# Altium footprint library DPIAT_202303.PcbLib: 77 footprints (part 5 of 5)
Each footprint in its own frame and in the unit in brackets; x right, y up, seen from the top. Pads: shape width x height; smd on the part's side, far side on the other; paste and mask are expansions set on the pad; w line width, h text height; cw(c..) or ccw(c..) is an arc to the next point about the centre after c.
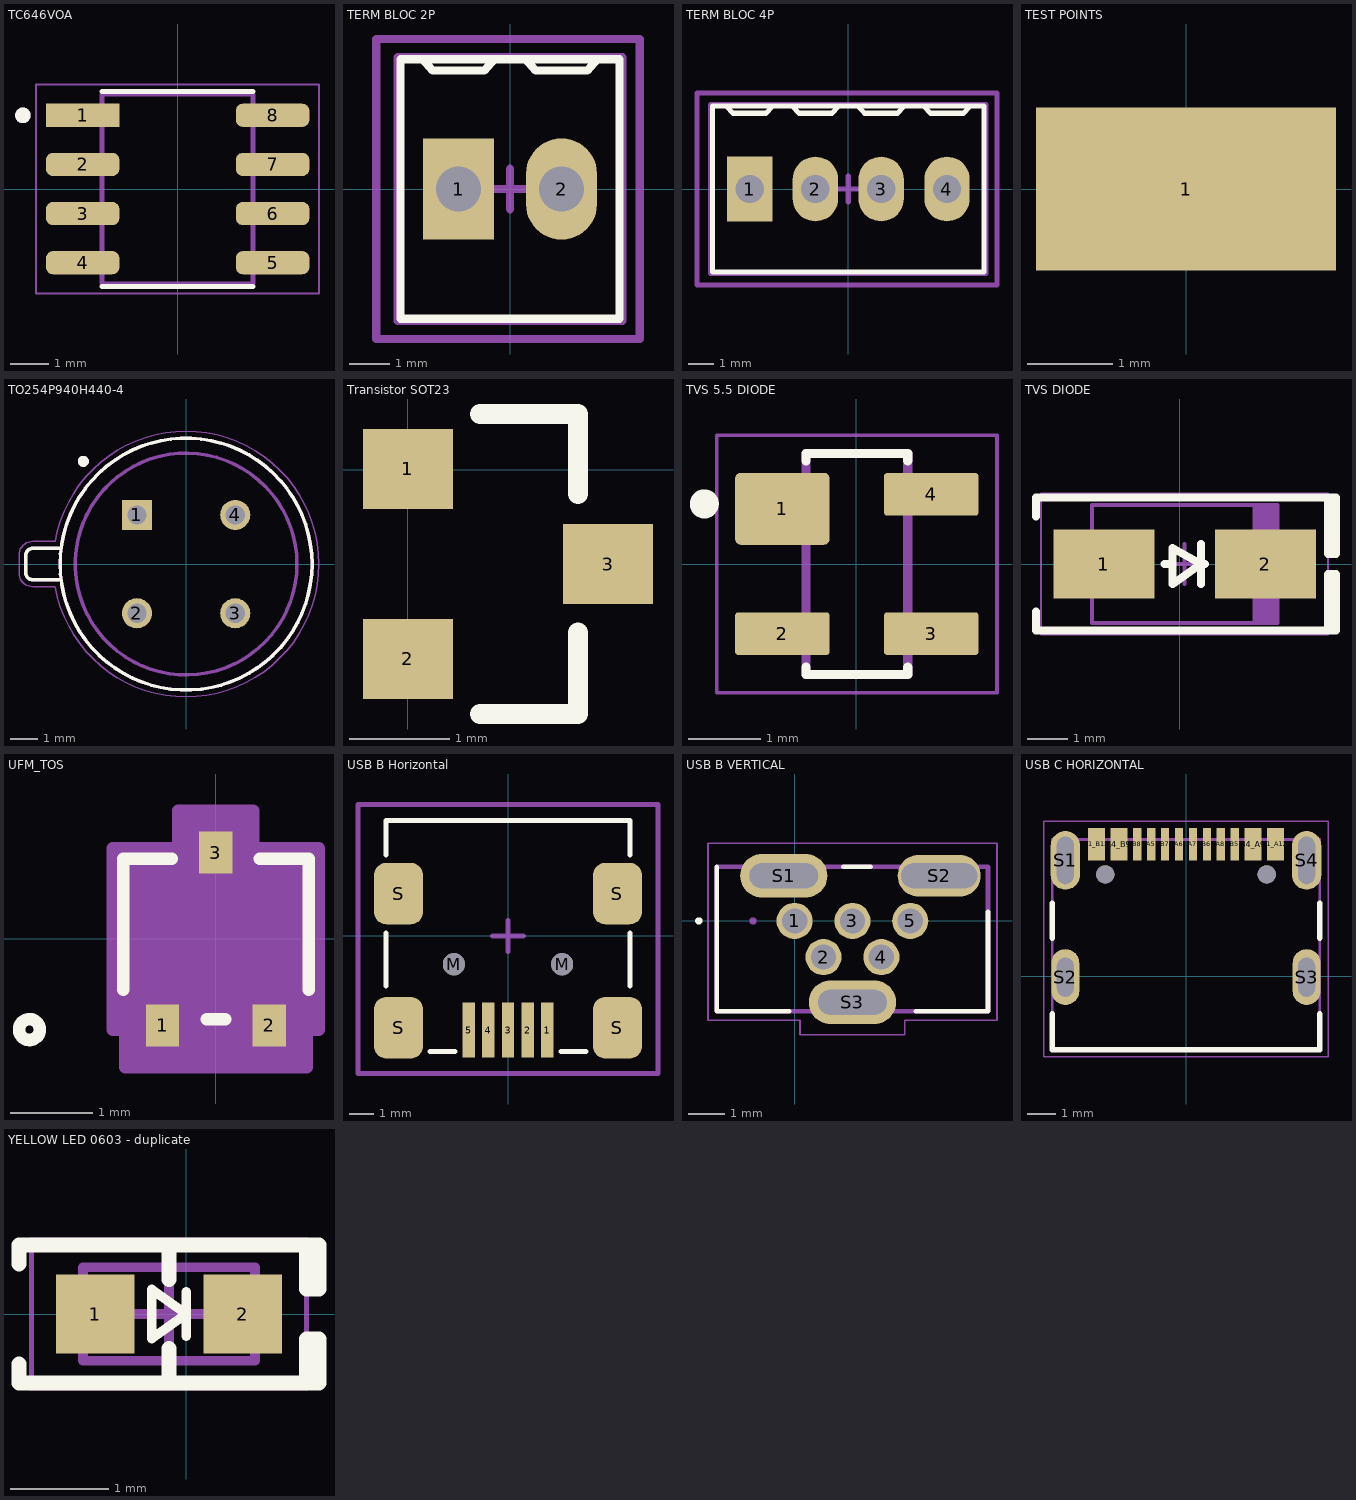
[diagram p4: the footprints below, top view; thin cyan lines are the x and y axes]

## TC646VOA [mm] "Motor Drive"
pads (8):
  rect 1.9x0.6 smd: 1(-2.455,1.905)
  rrect60% 1.9x0.6 smd: 2(-2.455,0.635) 3(-2.455,-0.635) 4(-2.455,-1.905) 5(2.455,-1.905) 6(2.455,-0.635) 7(2.455,0.635) 8(2.455,1.905)
Top Overlay:
  circle w0.2: c-4,1.905 r0.1
  lines w0.127: -1.95,-2.52 1.95,-2.52 ; -1.95,2.52 1.95,2.52
Mechanical 13:
  circle w0.2: c-4,1.905 r0.1
  lines w0.127: -1.95,-2.45 1.95,-2.45 1.95,2.45 -1.95,2.45 -1.95,-2.45
Mechanical 15:
  lines w0.05: -3.655,-2.7 3.655,-2.7 3.655,2.7 -3.655,2.7 -3.655,-2.7
3D body "step_temp.STEP": height 1.75, standoff 0, extent -2.997,-2.451 2.997,2.451

## TERM BLOC 2P [mm]
pads (2):
  rect 1.75x2.5 hole 1.1: 1(-1.27,0)
  oval 1.75x2.5 hole 1.1: 2(1.27,0)
Top Overlay:
  lines w0.2: -2.159,3.2 -1.905,2.921 -0.635,2.921 -0.381,3.2 ; 0.381,3.2 0.635,2.921 1.905,2.921 2.159,3.2 ; -2.7,-3.2 -2.6,-3.2 2.7,-3.2 2.7,3.2 -2.7,3.2 -2.7,-3.2
Mechanical 13:
  lines w0.2: -2.77,-3.25 -2.77,3.25 2.77,3.25 2.77,-3.25 -2.77,-3.25
Mechanical 15:
  lines w0.2: -0.5,0 0.5,0 ; 0,-0.5 0,0.5 ; -3.3,-3.7 3.2,-3.7 3.2,-2.9 3.2,3.7 -3.3,3.7 -3.3,-3.3 -3.3,-3.7
3D body "TE Term Block 2port 282834-2-c-3d.STEP": height 10, standoff -3.4, extent -2.77,-3.25 2.77,3.25

## TERM BLOC 4P [mm]
pads (4):
  rect 1.75x2.5 hole 1.1: 1(-3.81,0)
  oval 1.75x2.5 hole 1.1: 2(-1.27,0) 3(1.27,0) 4(3.81,0)
Top Overlay:
  lines w0.2: -4.699,3.2 -4.445,2.921 -3.175,2.921 -2.921,3.2 ; -2.159,3.2 -1.905,2.921 -0.635,2.921 -0.381,3.2 ; 0.381,3.2 0.635,2.921 1.905,2.921 2.159,3.2 ; 2.921,3.2 3.175,2.921 4.445,2.921 4.699,3.2 ; -5.24,-3.2 -5.14,-3.2 5.24,-3.2 5.24,3.2 -5.24,3.2 -5.24,-3.2
Mechanical 13:
  lines w0.2: -5.31,-3.25 -5.31,3.25 5.31,3.25 5.31,-3.25 -5.31,-3.25
Mechanical 15:
  lines w0.2: -0.5,0 0.5,0 ; 0,-0.5 0,0.5 ; -5.84,-3.7 5.74,-3.7 5.74,-2.9 5.74,3.7 -5.84,3.7 -5.84,-3.3 -5.84,-3.7
3D body "TE Term Block 4port 282834-4-c-3d.STEP": height 10, standoff -3.4, extent -5.31,-3.25 5.31,3.25

## TEST POINTS [mm]
pads (1):
  rect 3.5x1.9 smd: 1(0,0)
3D body "RCWCTE--3DModel-STEP-56544.STEP": height 2.01, standoff 0, extent -1.6,-0.8 1.6,0.8

## TO254P940H440-4 [mm]
pads (4):
  rect 1.1x1.1 hole 0.7: 1(-1.796,1.796)
  round 1.1 hole 0.7: 2(-1.796,-1.796) 3(1.796,-1.796) 4(1.796,1.796)
Top Overlay:
  circle w0.2: c-3.75,3.75 r0.1
  circle w0.127: c0,0 r4.6
  lines w0.127: -4.6,-0.575 -5.6,-0.575 cw(c-5.6,-0.325) -5.85,-0.325 -5.85,0.325 cw(c-5.6,0.325) -5.6,0.575 -4.6,0.575
Mechanical 13:
  circle w0.127: c0,0 r4.6
  circle w0.2: c-3.75,3.75 r0.1
  circle w0.127: c0,0 r4.05
  lines w0.127: -4.6,-0.575 -5.6,-0.575 cw(c-5.6,-0.325) -5.85,-0.325 -5.85,0.325 cw(c-5.6,0.325) -5.6,0.575 -4.6,0.575
Mechanical 15:
  lines w0.05: -4.78,-0.825 -5.6,-0.825 cw(c-5.6,-0.325) -6.1,-0.325 -6.1,0.325 cw(c-5.6,0.325) -5.6,0.825 -4.78,0.825 ; -4.777,-0.84 ccw(c0.002,0.003) 0.002,-4.85 ; -4.777,0.842 cw(c-0.001,0) -0.001,4.85 ; 0,-4.85 ccw(c0,0) 0,4.85

## Transistor SOT23 [mm] "Model inspired by Trans N-CHANNEL"
pads (3):
  rect 0.9x0.8 smd: 1(0.001,0.006) 2(0.001,-1.894) 3(2.001,-0.944)
Top Overlay:
  lines w0.2: 0.721,-2.444 1.701,-2.444 1.701,-1.629 ; 0.721,0.556 1.701,0.556 1.701,-0.244
3D body "FDN359AN.STEP": height 1.12, standoff 0, extent -0.34,-2.419 2.17,0.501

## TVS 5.5 DIODE [mm] "TVS diode"
pads (4):
  rrect15% 1.3x0.99 smd: 1(-1.016,0.762)
  rrect15% 1.3x0.59 smd: 2(-1.016,-0.958) 3(1.034,-0.958) 4(1.034,0.962)
Top Overlay:
  circle w0.2: c-2.091,0.829 r0.1
  lines w0.127: -0.691,-1.418 -0.691,-1.518 0.709,-1.518 0.709,-1.418 ; -0.691,1.422 -0.691,1.522 0.709,1.522 0.709,1.422
Mechanical 13:
  lines w0.127: -0.691,-1.518 -0.691,1.522 0.709,1.522 0.709,-1.518 -0.691,-1.518
Mechanical 15:
  lines w0.05: -1.921,-1.768 -1.921,1.772 1.939,1.772 1.939,-1.768 -1.921,-1.768
3D body "SP0503BAHTG--3DModel-STEP-56544.STEP": height 1.22, standoff 0, extent -1.176,-1.458 1.194,1.462

## TVS DIODE [mm]
pads (2):
  rect 2.5x1.7 smd: 1(-1.873,0) 2(2.127,0)
Top Overlay:
  lines w0.2: -3.556,-1.175 -3.556,-1.651 3.877,-1.651 3.877,-0.254 3.683,-0.254 3.683,-1.651 ; -3.556,1.175 -3.556,1.651 3.877,1.651 3.877,0.254 3.683,0.254 3.683,1.651 ; -0.373,0 -0.173,0 ; 0.527,-0.5 0.527,0.5 ; 0.627,0 0.527,0 ; 0.527,0 -0.173,-0.5 -0.173,0.4 0.527,0
Mechanical 13:
  rectangle: 1.808,-1.46 2.427,1.46
  lines w0.1: -2.173,-1.46 2.427,-1.46 2.427,1.46 -2.173,1.46 -2.173,-1.46
Mechanical 15:
  lines w0.05: -3.429,-1.75 3.683,-1.75 3.683,1.75 -3.429,1.75 -3.429,-1.75
  lines w0.1: -0.373,0 0.627,0 ; 0.127,-0.5 0.127,0.5
3D body "SMA.STEP": height 2.4, standoff 0, extent -2.473,-1.375 2.727,1.375

## UFM_TOS [mil]
pads (3):
  rect 16x20 smd paste+0 mask+0: 1(-25.59,-41.5) 2(25.59,-41.5) 3(0,41.5)
Top Overlay:
  circle w6: c-89.5,-43.5 r5
  lines w6: -44.5,-24.25 -44.5,38.5 -21.1,38.5 ; -4.49,-38.5 4.49,-38.5 ; 21.1,38.5 44.5,38.5 44.5,-24.25
Mechanical 13:
  circle w0: c-29.5,-23.5 r5
  lines w1: -39.5,-33.5 39.5,-33.5 39.5,33.5 -39.5,33.5 -39.5,-33.5 ; -33.59,-43.5 -33.59,-33.5 -17.59,-33.5 -17.59,-43.5 -33.59,-43.5 ; -8,33.5 8,33.5 8,43.5 -8,43.5 -8,33.5 ; 17.59,-43.5 17.59,-33.5 33.59,-33.5 33.59,-43.5 17.59,-43.5
Mechanical 15:
  region: -49.5,-43.5 -49.5,43.5 -18,43.5 -18,61.5 18,61.5 18,43.5 49.5,43.5 49.5,-43.5 43.59,-43.5 43.59,-61.5 -43.59,-61.5 -43.59,-43.5
  region: 39.5,-33.5 -39.5,-33.5 -39.5,33.5 39.5,33.5
  lines w6: -49.5,-43.5 -49.5,43.5 -18,43.5 -18,61.5 18,61.5 18,43.5 49.5,43.5 49.5,-43.5 43.59,-43.5 43.59,-61.5 -43.59,-61.5 -43.59,-43.5 -49.5,-43.5
3D body "UFM_TOS.step": height 32.09, standoff 0, extent -39.49,-37.5 39.49,37.5

## USB B Horizontal [mm]
pads (11):
  rect 0.5x2.25 smd: 1(1.6,-3.826) 2(0.8,-3.826) 3(0,-3.826) 4(-0.8,-3.826) 5(-1.6,-3.826)
  round 0.9 hole 0.9 unplated: M(-2.2,-1.151) M(2.2,-1.151)
  rrect50% 2x2.5 smd: S(-4.45,-3.731) S(-4.45,1.719) S(4.45,-3.731) S(4.45,1.719)
Top Overlay:
  lines w0.2: -4.953,-2.04 -4.953,0.119 ; -4.953,3.294 -4.953,4.691 4.953,4.691 4.953,3.294 ; -3.175,-4.707 -2.159,-4.707 ; 2.159,-4.707 3.175,-4.707 ; 4.953,-2.04 4.953,0.119
Mechanical 15:
  lines w0.2: -0.635,0 0.635,0 ; 0,-0.635 0,0.635 ; -6.096,-5.588 6.096,-5.588 6.096,5.334 -6.096,5.334 -6.096,-5.588
3D body "FCI USB 10033526-N3212LF.STEP": height 4.01, standoff -0.99, extent -4.95,-4.701 4.95,4.699

## USB B VERTICAL [mm] "USB B"
pads (8):
  round 1 hole 0.7: 1(0,0) 2(0.8,-1) 3(1.6,0) 4(2.4,-1) 5(3.2,0)
  oval 2.416x1.208 hole 0.7 slot 1.9 at 0 deg: S1(-0.3,1.25) S3(1.6,-2.25)
  oval 2.3x1.15 hole 0.7 slot 2.1 at 0 deg: S2(4,1.25)
Top Overlay:
  circle w0.102: c-2.65,0 r0.051
  lines w0.127: -2.15,1.5 -2.15,-2.5 -0.15,-2.5 ; 1.35,1.5 2.1,1.5 ; 3.35,-2.5 5.35,-2.5 5.35,0.25
Mechanical 13:
  circle w0.102: c-1.15,0 r0.051
  lines w0.127: -2.15,-2.5 -2.15,1.5 5.35,1.5 5.35,-2.5 -2.15,-2.5
Mechanical 15:
  lines w0.05: -2.4,-2.75 -2.4,2.15 5.6,2.15 5.6,-2.75 3.05,-2.75 3.05,-3.15 0.15,-3.15 0.15,-2.75 -2.4,-2.75
3D body "1734753-1.stp": height 9, standoff -2.3, extent -2.199,-2.458 5.501,1.632

## USB C HORIZONTAL [mm] "USB C 16 pins"
pads (18):
  rect 0.6x1.15 smd: A1_B12(-3.2,4.73) A4_B9(-2.4,4.73) B1_A12(3.2,4.73) B4_A9(2.4,4.73)
  rect 0.3x1.15 smd: A5(-1.25,4.73) A6(-0.25,4.73) A7(0.25,4.73) A8(1.25,4.73) B5(1.75,4.73) B6(0.75,4.73) B7(-0.75,4.73) B8(-1.75,4.73)
  oval 1.05x2.1 hole 0.6 slot 1.7 at 90 deg: S1(-4.32,4.155) S4(4.32,4.155)
  oval 1x2 hole 0.6 slot 1.4 at 90 deg: S2(-4.32,-0.025) S3(4.32,-0.025)
  round 0.65 hole 0.65 unplated: ""(-2.89,3.655) ""(2.89,3.655)
Top Overlay:
  lines w0.2: -4.79,-1.345 -4.79,-2.625 4.79,-2.625 4.79,-1.345 ; -4.79,1.375 -4.79,2.625 ; 4.79,1.375 4.79,2.625
Mechanical 13:
  lines w0.1: -4.79,-2.625 -4.79,4.905 4.79,4.905 4.79,-2.625 -4.79,-2.625
Mechanical 15:
  lines w0.05: -5.1,-2.875 5.1,-2.875 5.1,5.555 -5.1,5.555 -5.1,-2.875
3D body "step_temp.STEP": height 3.31, standoff -0.85, extent -4.79,-2.625 4.79,5.085

## YELLOW LED 0603 - duplicate [mm] "Yellow led 0603 SMD"
pads (2):
  rect 0.8x0.8 smd: 1(-0.925,0) 2(0.575,0)
Top Overlay:
  lines w0.1: 0,-0.225 0,0 ; 0,0.225 0,0 ; 0,0 -0.35,-0.25 -0.35,0 -0.35,0.25 0,0
  lines w0.15: -1.699,-0.508 -1.699,-0.7 1.225,-0.7 ; -1.699,0.508 -1.699,0.7 1.325,0.7 ; -0.175,-0.7 -0.175,-0.35 ; -0.175,0.35 -0.175,0.7 ; 1.222,-0.7 1.222,-0.254 1.349,-0.254 1.349,-0.7 1.222,-0.7 ; 1.222,0.254 1.222,0.7 1.349,0.7 1.349,0.254 1.222,0.254
Mechanical 13:
  lines w0.1: -1.05,-0.475 0.7,-0.475 0.7,0.475 -1.05,0.475 -1.05,-0.475
Mechanical 15:
  lines w0.05: -1.572,-0.75 1.222,-0.75 1.222,0.75 -1.572,0.75 -1.572,-0.75
  lines w0.1: -0.65,0 0.3,0 ; -0.175,-0.475 -0.175,0.475
3D body "LED 0603 Base YELLOW.STEP": height 0.28, standoff 0, extent -0.848,-0.4 0.752,0.4
3D body "LED 0603 Lens YELLOW.STEP": height 0.53, standoff 0.18, extent -0.598,-0.4 0.502,0.4